# Altium footprint library agus_lib.PcbLib: 45 footprints (part 3 of 3)
Each footprint in its own frame and in the unit in brackets; x right, y up, seen from the top. Pads: shape width x height; smd on the part's side, far side on the other; paste and mask are expansions set on the pad; w line width, h text height; cw(c..) or ccw(c..) is an arc to the next point about the centre after c.
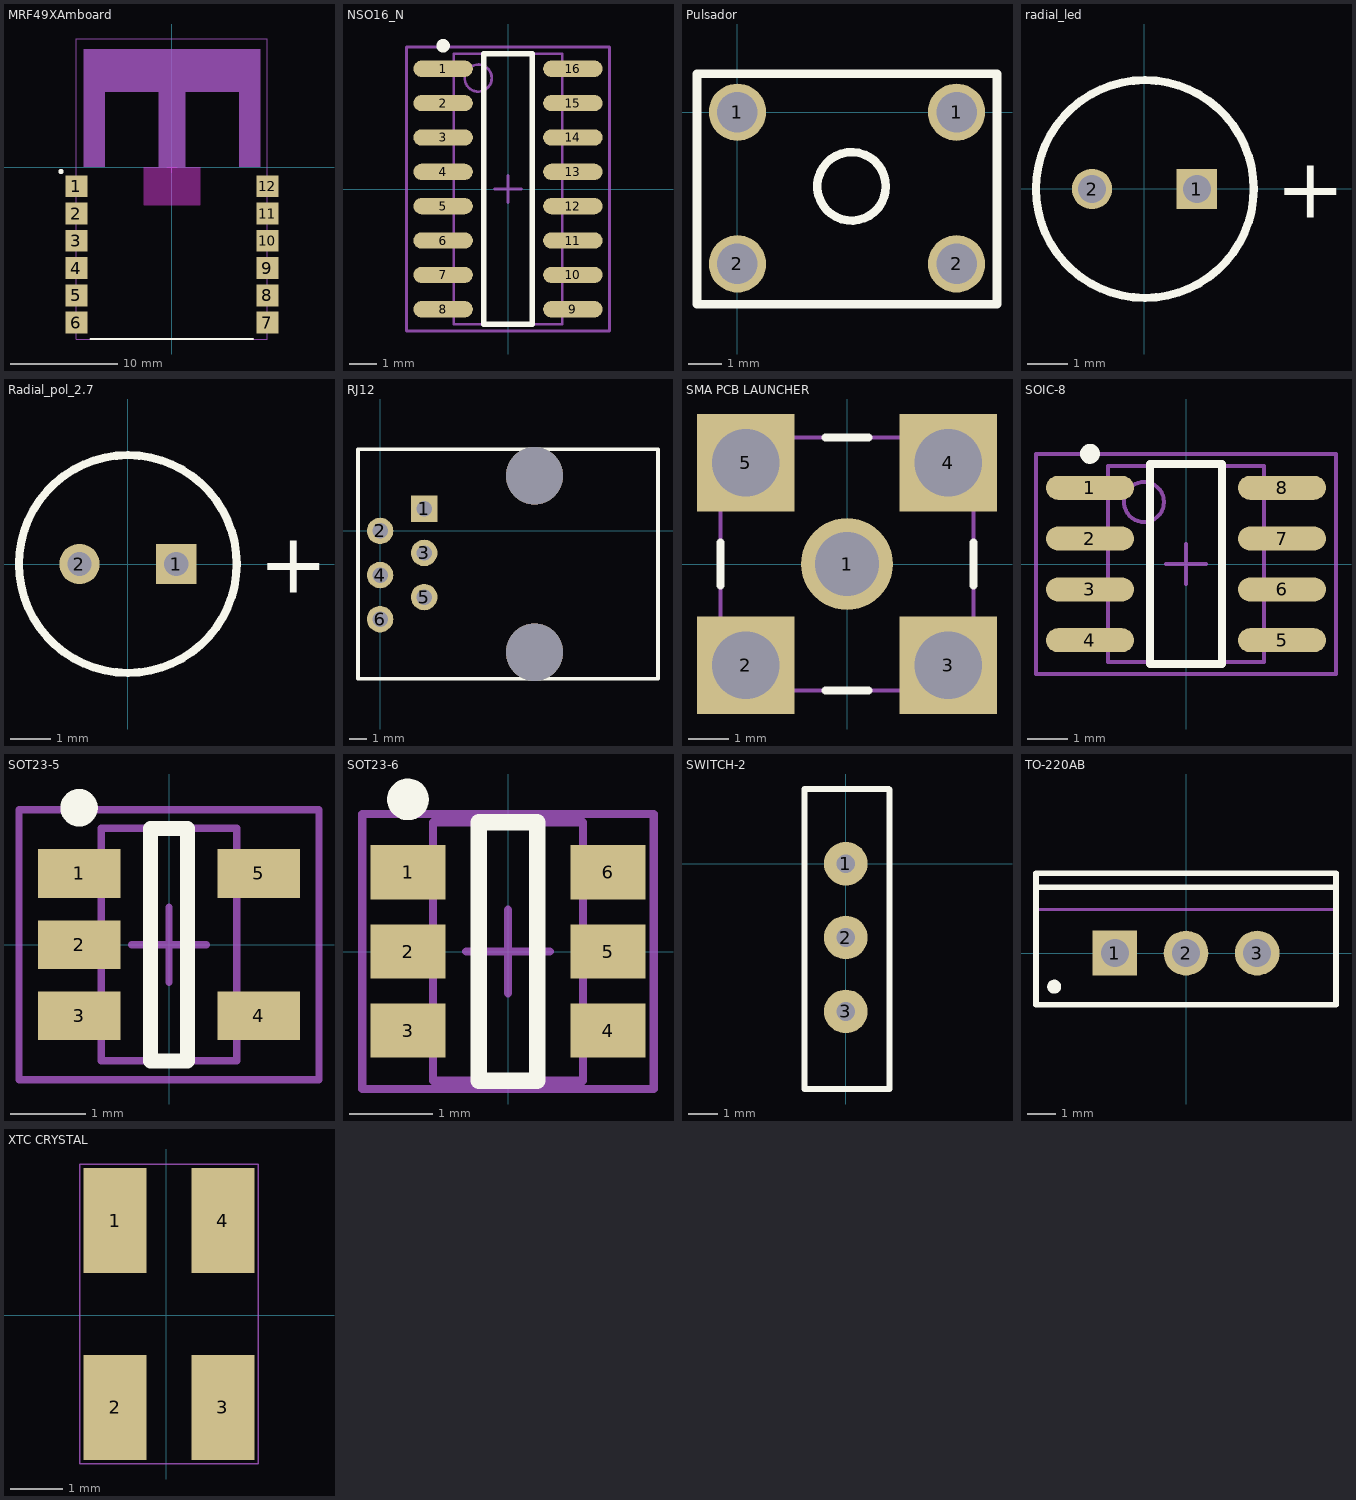
[diagram p2: the footprints below, top view; thin cyan lines are the x and y axes]

## MRF49XAmboard [mil] "SM Module; 12 Leads; Body 27.9x17.8x1.7mm (LxWxH), Microchip Recommended"
height 66.93
pads (12):
  rect 80x80 smd paste-159.45 mask+2: 1(-350,-70) 2(-350,-170) 3(-350,-270) 4(-350,-370) 5(-350,-470) 6(-350,-570) 7(350,-570) 8(350,-470) 9(350,-370) 10(350,-270) 11(350,-170) 12(350,-70)
Top Layer keep-out:
  rectangle: -105,-140 105,0
Top Overlay:
  circle w9.84: c-406.5,-15.75 r4.92
  lines w7.87: -297.64,-630 297.64,-630
Mechanical 13:
  rectangle: -324.8,275.59 324.8,433.07
  rectangle: -324.8,0 -246.06,275.59
  region: 324.8,275.59 246.06,275.59 246.06,0 324.8,0
  rectangle: -49.21,0 49.21,275.59
  lines w3.94: 350,-630 350,470 ; 350.39,-630 -350,-630 -350,470 350.39,470
Mechanical 15:
  lines w3.94: -19.69,0 19.68,0 ; 0,-19.68 0,19.69
3D body: height 2278.62, standoff -105.71, extent -412.08,-630.31 407.37,626.66

## NSO16_N [mm] "SOIC, 16-Leads, Body 9.9x3.9mm, Pitch 1.27mm, IPC Medium Density"
height 1.75
pads (16):
  oval 2.2x0.6 smd: 1(-2.4,4.445) 2(-2.4,3.175) 3(-2.4,1.905) 4(-2.4,0.635) 5(-2.4,-0.635) 6(-2.4,-1.905) 7(-2.4,-3.175) 8(-2.4,-4.445) 9(2.4,-4.445) 10(2.4,-3.175) 11(2.4,-1.905) 12(2.4,-0.635) 13(2.4,0.635) 14(2.4,1.905) 15(2.4,3.175) 16(2.4,4.445)
Top Overlay:
  circle w0.25: c-2.4,5.295 r0.125
  lines w0.2: -0.9,-5 -0.9,5 0.9,5 0.9,-5 -0.9,-5
Mechanical 13:
  circle w0.1: c-1.1,4.1 r0.5
  lines w0.1: -2,-5 -2,5 2,5 2,-5 -2,-5
Mechanical 15:
  lines w0.1: -0.5,0 0.5,0 ; 0,-0.5 0,0.5 ; -3.75,-5.25 -3.75,5.25 3.75,5.25 3.75,-5.25 -3.75,-5.25
3D body: height 1.75, standoff 0, extent -2,-5 2,5

## Pulsador [mm]
pads (4):
  round 1.7 hole 1.2: 1(0,0) 1(6.5,0) 2(0,-4.5) 2(6.5,-4.5)
Top Overlay:
  circle w0.254: c3.384,-2.2 r1.016
  lines w0.254: 6.1,-5.7 7.7,-5.7 7.7,1.143 -1.2,1.143 -1.2,-5.7 6.111,-5.7
3D body: height 5, standoff 0, extent -1.24,-5.25 7.76,0.75

## radial_led [mm]
pads (2):
  rect 1x1 hole 0.7: 1(1.3,-0.01)
  round 1 hole 0.7: 2(-1.3,-0.01)
Top Overlay:
  circle w0.2: c0.01,-0.01 r2.7
  text "+" at 3.25,-0.72 h1.5
3D body: height 5.38, standoff -3.17, extent -2.004,-1.506 1.98,1.986

## Radial_pol_2.7 [mm] "Polarized Capacitor (Radial); 2 Leads"
pads (2):
  rect 1x1 hole 0.6: 1(1.2,0)
  round 1 hole 0.6: 2(-1.2,0)
Top Overlay:
  circle w0.2: c0,0 r2.7
  text "+" at 3.24,-0.71 h1.5
3D body: height 12.8, standoff -3.8, extent -2.79,-2.54 2.79,2.539

## RJ12 [mil]
pads (6):
  rect 60x60 hole 35: 1(100,50)
  round 60 hole 35: 2(0,0) 3(100,-50) 4(0,-100) 5(100,-150) 6(0,-200)
via 350,125 diameter 130 hole 130
via 350,-275 diameter 130 hole 130
Top Overlay:
  lines w8: -50,-335 630,-335 630,185 -50,185 -50,-335
3D body: height 629.92, standoff -157.48, extent -59.65,-384.25 750.2,235.82

## SMA PCB LAUNCHER [mm]
pads (5):
  round 2.3 hole 1.6: 1(0,0)
  rect 2.44x2.44 hole 1.7: 2(-2.54,-2.54) 3(2.54,-2.54) 4(2.54,2.54) 5(-2.54,2.54)
Top Overlay:
  lines w0.2: -3.175,-0.54 -3.175,0.54 ; -0.54,-3.175 0.54,-3.175 ; -0.54,3.175 0.54,3.175 ; 3.175,-0.54 3.175,0.54
Mechanical 13:
  lines w0.1: -3.175,-3.175 -3.175,3.175 3.175,3.175 3.175,-3.175 -3.175,-3.175
3D body: height 8.93, standoff -4.68, extent -3.165,-3.15 3.145,3.16
3D body: height 55.88, standoff -1.4, extent -6.4,-6.4 6.4,6.4

## SOIC-8 [mm] "SOIC, 8-Leads, Body 4.9x3.9mm, Pitch 1.27mm, IPC Medium Density"
height 1.75
pads (8):
  oval 2.2x0.6 smd: 1(-2.4,1.905) 2(-2.4,0.635) 3(-2.4,-0.635) 4(-2.4,-1.905) 5(2.4,-1.905) 6(2.4,-0.635) 7(2.4,0.635) 8(2.4,1.905)
Top Overlay:
  circle w0.25: c-2.4,2.755 r0.125
  lines w0.2: -0.9,-2.5 0.9,-2.5 0.9,2.5 -0.9,2.5 -0.9,-2.5
Mechanical 13:
  circle w0.1: c-1.05,1.55 r0.5
  lines w0.1: -1.95,-2.45 1.95,-2.45 1.95,2.45 -1.95,2.45 -1.95,-2.45
Mechanical 15:
  lines w0.1: -0.5,0 0.5,0 ; 0,-0.5 0,0.5 ; -3.75,-2.75 3.75,-2.75 3.75,2.75 -3.75,2.75 -3.75,-2.75
3D body: height 1.75, standoff 0, extent -3.006,-2.5 3.006,2.5

## SOT23-5 [mm] "SOT23, 5-Leads, Body 2.9x1.6mm, Pitch 0.95mm, Lead Span 2.8mm, IPC Medium Density"
height 1.1
pads (5):
  rect 1.1x0.65 smd: 1(-1.2,0.95) 2(-1.2,0) 3(-1.2,-0.95) 4(1.2,-0.95) 5(1.2,0.95)
Top Overlay:
  circle w0.25: c-1.2,1.825 r0.125
  lines w0.2: -0.25,-1.55 0.25,-1.55 0.25,1.55 -0.25,1.55 -0.25,-1.55
Mechanical 13:
  lines w0.1: -0.9,-1.55 -0.9,1.55 0.9,1.55 0.9,-1.55 -0.9,-1.55
Mechanical 15:
  lines w0.1: -0.5,0 0.5,0 ; 0,-0.5 0,0.5 ; -2,-1.8 -2,1.8 2,1.8 2,-1.8 -2,-1.8
3D body: height 0.94, standoff -0.02, extent -1.535,-1.46 1.655,1.44

## SOT23-6 [mm] "SOT23, 6-Leads, Body 2.9x1.6mm, Pitch 0.95mm, Lead Span 2.8mm, IPC High Density"
height 1.45
pads (6):
  rect 0.9x0.65 smd: 1(-1.2,0.95) 2(-1.2,0) 3(-1.2,-0.95) 4(1.2,-0.95) 5(1.2,0) 6(1.2,0.95)
Top Overlay:
  circle w0.25: c-1.2,1.825 r0.125
  lines w0.2: -0.35,-1.55 0.35,-1.55 0.35,1.55 -0.35,1.55 -0.35,-1.55
Mechanical 13:
  lines w0.1: -0.9,-1.55 -0.9,1.55 0.9,1.55 0.9,-1.55 -0.9,-1.55
Mechanical 15:
  lines w0.1: -0.5,0 0.5,0 ; 0,-0.5 0,0.5 ; -1.75,-1.65 -1.75,1.65 1.75,1.65 1.75,-1.65 -1.75,-1.65
3D body: height 1.45, standoff 0, extent -0.9,-1.55 0.9,1.55
3D body: height 1.3, standoff 0, extent -1.5,-1.5 1.5,1.5

## SWITCH-2 [mm]
pads (3):
  round 1.5 hole 0.65: 1(0,0) 2(0,-2.54) 3(0,-5.08)
Top Overlay:
  lines w0.2: -1.415,-7.75 -0.536,-7.75 0.621,-7.75 1.5,-7.75 1.5,-4.9 1.5,2.55 1.48,2.57 -0.125,2.57 -1.415,2.57 -1.415,-7.75
3D body: height 14.1, standoff -3.8, extent -3.75,-8.79 3.75,3.71

## TO-220AB [mm] "TO, Thru-Hole, Vertical, Heatsink Mounted; 3 In-Line Leads; Pitch 2.54 mm"
height 19.3
pads (3):
  rect 1.6x1.6 hole 1: 1(-2.54,0)
  round 1.6 hole 1: 2(0,0) 3(2.54,0)
Top Overlay:
  circle w0.25: c-4.7,-1.2 r0.125
  lines w0.2: -5.35,2.35 5.35,2.35 ; -5.35,-1.85 -5.35,2.85 5.35,2.85 5.35,-1.85 -5.35,-1.85
Mechanical 13:
  lines w0.1: -5.35,1.55 5.35,1.55 ; -5.35,-1.85 5.35,-1.85 5.35,2.85 -5.35,2.85 -5.35,-1.85
Mechanical 15:
  lines w0.1: -0.5,0 0.5,0 ; 0,-0.5 0,0.5
3D body: height 2, standoff -5.2, extent -5.1,-0.365 5.06,19.125

## XTC CRYSTAL [mm] "10 MHz 10 ppm 10pF"
pads (4):
  rect 1.2x2 smd: 1(-0.975,1.8) 2(-0.975,-1.75) 3(1.075,-1.75) 4(1.075,1.8)
Mechanical 13:
  lines w0.025: -1.65,-2.825 1.75,-2.825 1.75,2.875 -1.65,2.875 -1.65,-2.825
3D body: height 0.9, standoff -0.05, extent -1.55,-2.5 1.65,2.5